# Altium footprint library Connektor.PcbLib: 305 footprints (part 6 of 20)
Each footprint in its own frame and in the unit in brackets; x right, y up, seen from the top. Pads: shape width x height; smd on the part's side, far side on the other; paste and mask are expansions set on the pad; w line width, h text height; cw(c..) or ccw(c..) is an arc to the next point about the centre after c.
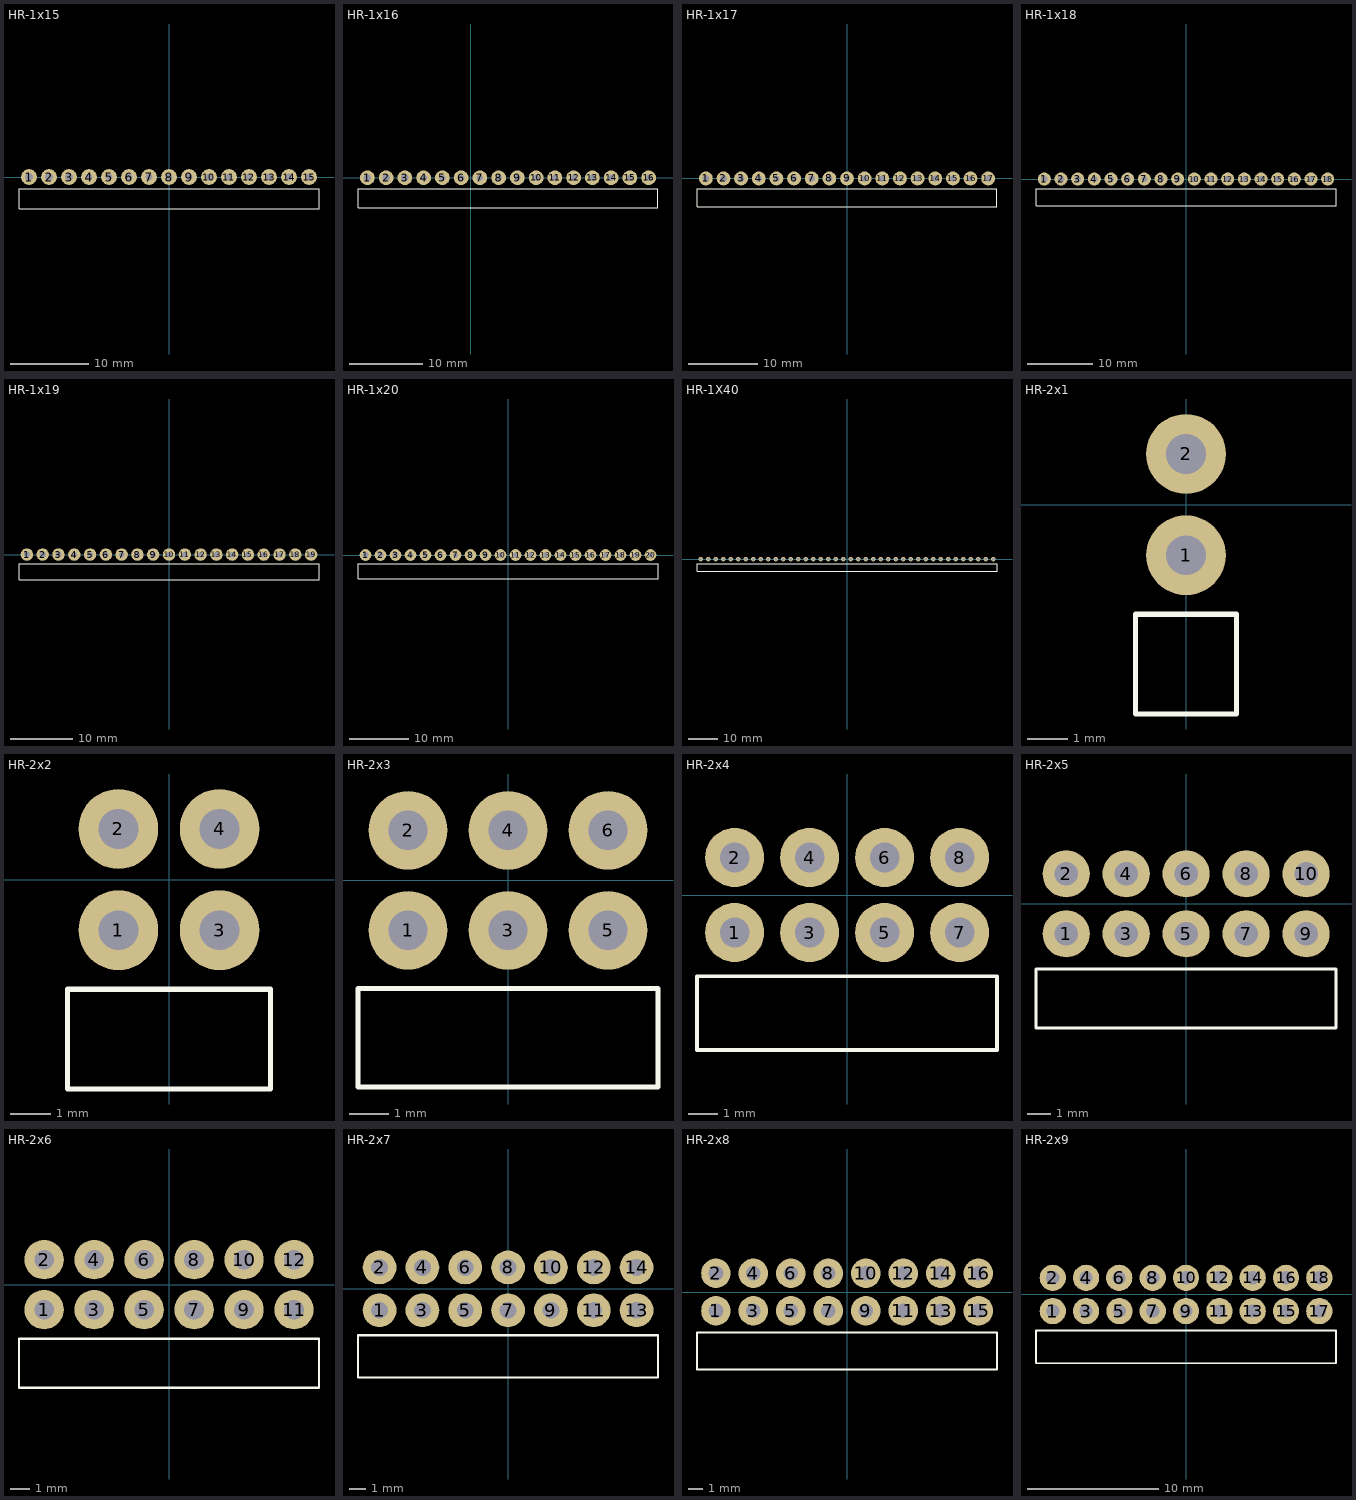
[diagram p5: the footprints below, top view; thin cyan lines are the x and y axes]

## HR-1x15 [mm]
pads (15):
  round 2 hole 1: 1(-17.78,0) 2(-15.24,0) 3(-12.7,0)
  round 2 hole 0.9: 4(-10.16,0) 5(-7.62,0) 6(-5.08,0) 7(-2.54,0) 8(0,0) 9(2.54,0) 10(5.08,0) 11(7.62,0) 12(10.16,0) 13(12.7,0) 14(15.24,0) 15(17.78,0)
TopOverlay:
  lines w0.127: -19.05,-4.04 -19.05,-1.5 19.05,-1.5 19.05,-4.04 -19.05,-4.04
3D body: height 2.54, standoff -2, extent -19.05,-10 19.05,0.325

## HR-1x16 [mm]
pads (16):
  round 2 hole 1: 1(-13.97,0) 2(-11.43,0) 3(-8.89,0)
  round 2 hole 0.9: 4(-6.35,0) 5(-3.81,0) 6(-1.27,0) 7(1.27,0) 8(3.81,0) 9(6.35,0) 10(8.89,0) 11(11.43,0) 12(13.97,0) 13(16.51,0) 14(19.05,0) 15(21.59,0) 16(24.13,0)
TopOverlay:
  lines w0.127: -15.24,-4.04 -15.24,-1.5 25.4,-1.5 25.4,-4.04 -15.24,-4.04
3D body: height 2.54, standoff -2, extent -15.24,-10 25.4,0.325

## HR-1x17 [mm]
pads (17):
  round 2 hole 1: 1(-20.32,0) 2(-17.78,0) 3(-15.24,0)
  round 2 hole 0.9: 4(-12.7,0) 5(-10.16,0) 6(-7.62,0) 7(-5.08,0) 8(-2.54,0) 9(0,0) 10(2.54,0) 11(5.08,0) 12(7.62,0) 13(10.16,0) 14(12.7,0) 15(15.24,0) 16(17.78,0) 17(20.32,0)
TopOverlay:
  lines w0.127: -21.59,-4.04 -21.59,-1.5 21.59,-1.5 21.59,-4.04 -21.59,-4.04
3D body: height 2.54, standoff -2, extent -21.59,-10 21.59,0.325

## HR-1x18 [mm]
pads (18):
  round 2 hole 1: 1(-21.59,0) 2(-19.05,0) 3(-16.51,0)
  round 2 hole 0.9: 4(-13.97,0) 5(-11.43,0) 6(-8.89,0) 7(-6.35,0) 8(-3.81,0) 9(-1.27,0) 10(1.27,0) 11(3.81,0) 12(6.35,0) 13(8.89,0) 14(11.43,0) 15(13.97,0) 16(16.51,0) 17(19.05,0) 18(21.59,0)
TopOverlay:
  lines w0.127: -22.86,-4.04 22.86,-4.04 22.86,-1.5 -22.86,-1.5 -22.86,-4.04
3D body: height 2.54, standoff -2, extent -22.86,-10 22.86,0.325

## HR-1x19 [mm]
pads (19):
  round 2 hole 1: 1(-22.86,0) 2(-20.32,0) 3(-17.78,0)
  round 2 hole 0.9: 4(-15.24,0) 5(-12.7,0) 6(-10.16,0) 7(-7.62,0) 8(-5.08,0) 9(-2.54,0) 10(0,0) 11(2.54,0) 12(5.08,0) 13(7.62,0) 14(10.16,0) 15(12.7,0) 16(15.24,0) 17(17.78,0) 18(20.32,0) 19(22.86,0)
TopOverlay:
  lines w0.127: -24.13,-4.04 -24.13,-1.5 24.13,-1.5 24.13,-4.04 -24.13,-4.04
3D body: height 2.54, standoff -2, extent -24.13,-10 24.13,0.325

## HR-1x20 [mm]
pads (20):
  round 2 hole 1: 1(-24.13,0) 2(-21.59,0) 3(-19.05,0)
  round 2 hole 0.9: 4(-16.51,0) 5(-13.97,0) 6(-11.43,0) 7(-8.89,0) 8(-6.35,0) 9(-3.81,0) 10(-1.27,0) 11(1.27,0) 12(3.81,0) 13(6.35,0) 14(8.89,0) 15(11.43,0) 16(13.97,0) 17(16.51,0) 18(19.05,0) 19(21.59,0) 20(24.13,0)
TopOverlay:
  lines w0.127: -25.4,-4.04 -25.4,-1.5 25.4,-1.5 25.4,-4.04 -25.4,-4.04
3D body: height 2.54, standoff -2, extent -25.4,-10 25.4,0.325

## HR-1X40 [mm]
pads (40):
  round 1.5 hole 0.9: 1(-49.53,0) 2(-46.99,0) 3(-44.45,0) 4(-41.91,0) 5(-39.37,0) 6(-36.83,0) 7(-34.29,0) 8(-31.75,0) 9(-29.21,0) 10(-26.67,0) 11(-24.13,0) 12(-21.59,0) 13(-19.05,0) 14(-16.51,0) 15(-13.97,0) 16(-11.43,0) 17(-8.89,0) 18(-6.35,0) 19(-3.81,0) 20(-1.27,0) 21(1.27,0) 22(3.81,0) 23(6.35,0) 24(8.89,0) 25(11.43,0) 26(13.97,0) 27(16.51,0) 28(19.05,0) 29(21.59,0) 30(24.13,0) 31(26.67,0) 32(29.21,0) 33(31.75,0) 34(34.29,0) 35(36.83,0) 36(39.37,0) 37(41.91,0) 38(44.45,0) 39(46.99,0) 40(49.53,0)
TopOverlay:
  lines w0.127: -50.8,-4.04 50.8,-4.04 50.8,-1.5 -50.8,-1.5 -50.8,-4.04
3D body: height 2.54, standoff -2, extent -50.8,-10 50.8,0.325

## HR-2x1 [mm]
pads (2):
  round 2 hole 1: 1(0,-1.27) 2(0,1.27)
TopOverlay:
  lines w0.127: -1.27,-5.25 1.27,-5.25 1.27,-2.75 -1.27,-2.75 -1.27,-5.25
3D body: height 5.08, standoff -2, extent -1.27,-11.25 1.27,1.612

## HR-2x2 [mm]
pads (4):
  round 2 hole 1: 1(-1.27,-1.27) 2(-1.27,1.27) 3(1.27,-1.27) 4(1.27,1.27)
TopOverlay:
  lines w0.127: -2.54,-5.25 -2.54,-2.75 2.54,-2.75 2.54,-5.25 -2.54,-5.25
3D body: height 5.08, standoff -2, extent -2.56,-11.25 2.52,1.612

## HR-2x3 [mm]
pads (6):
  round 2 hole 1: 1(-2.54,-1.27) 2(-2.54,1.27) 3(0,-1.27) 4(0,1.27) 5(2.54,-1.27) 6(2.54,1.27)
TopOverlay:
  lines w0.127: -3.81,-5.25 3.81,-5.25 3.81,-2.75 -3.81,-2.75 -3.81,-5.25
3D body: height 5.08, standoff -2, extent -3.82,-11.27 3.8,1.592

## HR-2x4 [mm]
pads (8):
  round 2 hole 1: 1(-3.81,-1.27) 2(-3.81,1.27) 3(-1.27,-1.27) 4(-1.27,1.27) 5(1.27,-1.27) 6(1.27,1.27) 7(3.81,-1.27) 8(3.81,1.27)
TopOverlay:
  lines w0.127: -5.085,-5.25 5.075,-5.25 5.075,-2.75 -5.085,-2.75 -5.085,-5.25
3D body: height 5.08, standoff -2, extent -5.085,-11.27 5.075,1.592

## HR-2x5 [mm]
pads (10):
  round 2 hole 1: 1(-5.08,-1.27) 2(-5.08,1.27) 3(-2.54,-1.27) 4(-2.54,1.27) 5(0,-1.27) 6(0,1.27) 7(2.54,-1.27) 8(2.54,1.27) 9(5.08,-1.27) 10(5.08,1.27)
TopOverlay:
  lines w0.127: -6.357,-5.25 -6.357,-2.75 6.348,-2.75 6.348,-5.25 -6.357,-5.25
3D body: height 5.08, standoff -3, extent -6.352,-11.27 6.348,1.592

## HR-2x6 [mm]
pads (12):
  round 2 hole 1: 1(-6.35,-1.27) 2(-6.35,1.27) 3(-3.81,-1.27) 4(-3.81,1.27) 5(-1.27,-1.27) 6(-1.27,1.27) 7(1.27,-1.27) 8(1.27,1.27) 9(3.81,-1.27) 10(3.81,1.27) 11(6.35,-1.27) 12(6.35,1.27)
TopOverlay:
  lines w0.127: -7.629,-5.25 -7.629,-2.75 7.619,-2.75 7.619,-5.25 -7.629,-5.25
3D body: height 5.08, standoff -2, extent -7.621,-11.25 7.619,1.612

## HR-2x7 [mm]
pads (14):
  round 2 hole 1: 1(-7.62,-1.27) 2(-7.62,1.27) 3(-5.08,-1.27) 4(-5.08,1.27) 5(-2.54,-1.27) 6(-2.54,1.27) 7(0,-1.27) 8(0,1.27) 9(2.54,-1.27) 10(2.54,1.27) 11(5.08,-1.27) 12(5.08,1.27) 13(7.62,-1.27) 14(7.62,1.27)
TopOverlay:
  lines w0.127: -8.899,-5.25 8.89,-5.25 8.89,-2.75 -8.899,-2.75 -8.899,-5.25
3D body: height 5.08, standoff -2, extent -8.89,-11.25 8.89,1.612

## HR-2x8 [mm]
pads (16):
  round 2 hole 1: 1(-8.89,-1.27) 2(-8.89,1.27) 3(-6.35,-1.27) 4(-6.35,1.27) 5(-3.81,-1.27) 6(-3.81,1.27) 7(-1.27,-1.27) 8(-1.27,1.27) 9(1.27,-1.27) 10(1.27,1.27) 11(3.81,-1.27) 12(3.81,1.27) 13(6.35,-1.27) 14(6.35,1.27) 15(8.89,-1.27) 16(8.89,1.27)
TopOverlay:
  lines w0.127: -10.17,-5.25 -10.17,-2.75 10.16,-2.75 10.16,-5.25 -10.17,-5.25
3D body: height 5.08, standoff -2, extent -10.16,-11.27 10.16,1.592

## HR-2x9 [mm]
pads (18):
  round 2 hole 1: 1(-10.16,-1.27) 2(-10.16,1.27) 3(-7.62,-1.27) 4(-7.62,1.27) 5(-5.08,-1.27) 6(-5.1,1.27) 7(-2.54,-1.27) 8(-2.54,1.27) 9(0,-1.27) 10(0,1.27) 11(2.54,-1.27) 12(2.54,1.27) 13(5.08,-1.27) 14(5.08,1.27) 15(7.62,-1.27) 16(7.62,1.27) 17(10.16,-1.27) 18(10.16,1.27)
TopOverlay:
  lines w0.127: -11.44,-5.25 -11.44,-2.75 11.43,-2.75 11.43,-5.25 -11.44,-5.25
3D body: height 5.08, standoff -2, extent -11.43,-11.27 11.43,1.592